# Altium footprint library Miscellaneous THD.PcbLib: 216 footprints (part 11 of 15)
Each footprint in its own frame and in the unit in brackets; x right, y up, seen from the top. Pads: shape width x height; smd on the part's side, far side on the other; paste and mask are expansions set on the pad; w line width, h text height; cw(c..) or ccw(c..) is an arc to the next point about the centre after c.
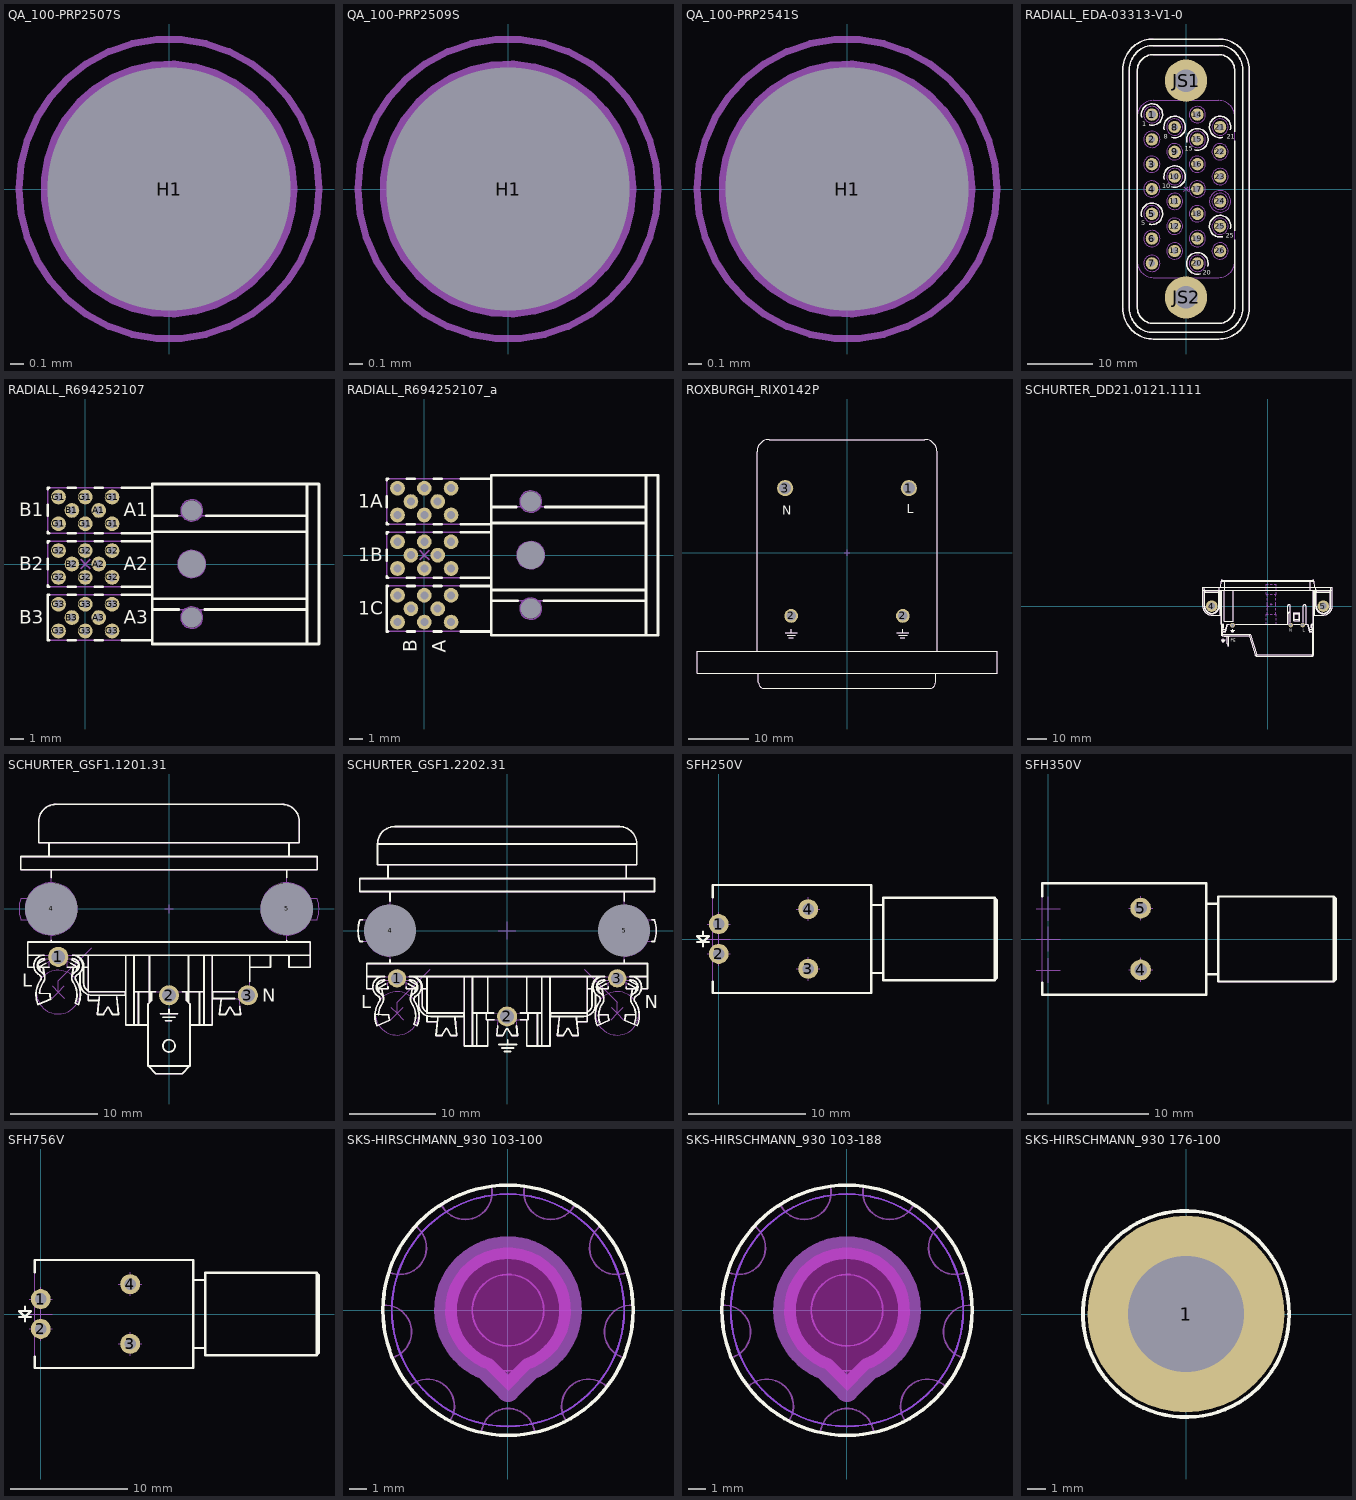
[diagram p10: the footprints below, top view; thin cyan lines are the x and y axes]

## QA_100-PRP2507S [mm] "Probe For 2.54mm Pitch, Torch Head"
height 20
pads (1):
  round 0.5 hole 1.75 unplated mask+0.625: H1(0,0)
Mechanical 8:
  lines w0.05: -0.5,0 0,0 ; 0,-0.5 0,0 ; 0,0.5 0,0 ; 0.5,0 0,0
Mechanical 14:
  circle w0.1: c0,0 r0.875
  lines w0.1: -0.375,-0.375 0.375,0.375 ; -0.375,0.375 0.375,-0.375
Mechanical 15:
  circle w0.05: c0,0 r1.08
Mechanical 16:
  circle w0.05: c0,0 r1.08
3D body "QA_100-PRP2507S.stp": height 14.75, standoff -31.96, extent -0.925,-0.925 0.925,0.925

## QA_100-PRP2509S [mm] "Probe For 2.54mm Pitch, Serrated Head"
height 20
pads (1):
  round 0.5 hole 1.75 unplated mask+0.625: H1(0,0)
Mechanical 8:
  lines w0.05: -0.5,0 0,0 ; 0,-0.5 0,0 ; 0,0.5 0,0 ; 0.5,0 0,0
Mechanical 14:
  circle w0.875: c0,0 r0.437
  circle w0.1: c0,0 r0.875
Mechanical 15:
  circle w0.05: c0,0 r1.08
Mechanical 16:
  circle w0.05: c0,0 r1.08
3D body "QA_100-PRP2509S.stp": height 14.75, standoff -31.96, extent -0.925,-0.925 0.925,0.925

## QA_100-PRP2541S [mm] "Probe For 2.54mm Pitch, Spear Head"
height 20
pads (1):
  round 0.5 hole 1.75 unplated mask+0.625: H1(0,0)
Mechanical 8:
  lines w0.05: -0.5,0 0,0 ; 0,-0.5 0,0 ; 0,0.5 0,0 ; 0.5,0 0,0
Mechanical 14:
  circle w0.2: c0,0 r0.1
  circle w0.1: c0,0 r0.875
Mechanical 15:
  circle w0.05: c0,0 r1.08
Mechanical 16:
  circle w0.05: c0,0 r1.08
3D body "QA_100-PRP2541S.stp": height 14.75, standoff -31.96, extent -0.925,-0.925 0.925,0.925

## RADIALL_EDA-03313-V1-0 [mm] "RADIALL 690522 Adapter Kit for PCB Mount, 26 Contacts Female, MMC Series"
height 33.2
pads (28):
  round 1.9 hole 1.2: 1(-5.239,11.43)
  round 1.9 hole 1: 2(-5.239,7.62) 3(-5.239,3.81) 4(-5.239,0) 5(-5.239,-3.81) 6(-5.239,-7.62) 7(-5.239,-11.43) 8(-1.746,9.525) 9(-1.746,5.715) 10(-1.746,1.905) 11(-1.746,-1.905) 12(-1.746,-5.715) 13(-1.746,-9.525) 14(1.746,11.43) 15(1.746,7.62) 16(1.746,3.81) 17(1.746,0) 18(1.746,-3.81) 19(1.746,-7.62) 20(1.746,-11.43) 21(5.239,9.525) 22(5.239,5.715) 23(5.239,1.905) 24(5.239,-1.905) 25(5.239,-5.715) 26(5.239,-9.525)
  round 6.5 hole 3.5: JS1(0,16.65) JS2(0,-16.65)
Top Overlay:
  lines w0.2: -6.833,-4.237 cw(c-5.239,-3.81) -5.666,-5.404 ; -6.833,11.003 cw(c-5.239,11.43) -5.666,9.836 ; -3.34,1.478 cw(c-1.746,1.905) -2.173,0.311 ; -3.34,9.098 cw(c-1.746,9.525) -2.173,7.931 ; 0.152,7.193 cw(c1.746,7.62) 1.319,6.026 ; 2.173,-13.024 cw(c1.746,-11.43) 3.34,-11.857 ; 5.666,-7.309 cw(c5.239,-5.715) 6.833,-6.142 ; 5.666,7.931 cw(c5.239,9.525) 6.833,9.098 ; 7.5,-7.8 7.5,-18.15 cw(c5,-18.15) 5,-20.65 -5,-20.65 cw(c-5,-18.15) -7.5,-18.15 -7.5,18.15 cw(c-5,18.15) -5,20.65 5,20.65 cw(c5,18.15) 7.5,18.15 7.5,8.8 ; 7.5,-6.4 7.5,7.4 ; -9.7,-18.35 ccw(c-5,-18.35) -5,-23.05 5,-23.05 ccw(c5,-18.35) 9.7,-18.35 9.7,18.35 ccw(c5,18.35) 5,23.05 -5,23.05 ccw(c-5,18.35) -9.7,18.35 -9.7,-18.35 ; -8.7,-18.35 ccw(c-5,-18.35) -5,-22.05 5,-22.05 ccw(c5,-18.35) 8.7,-18.35 8.7,18.35 ccw(c5,18.35) 5,22.05 -5,22.05 ccw(c-5,18.35) -8.7,18.35 -8.7,-18.35
  text "21" at 6.239,7.758 h0.75
  text "20" at 2.596,-13.197 h0.75
  text "25" at 6.089,-7.482 h0.75
  text "15" at -0.17,5.853 h0.75
  text "10" at -3.663,0.138 h0.75
  text "8" at -3.396,7.758 h0.75
  text "5" at -6.889,-5.577 h0.75
  text "1" at -6.739,9.663 h0.75
Mechanical 8:
  lines w0.1: -5.739,-11.43 -5.239,-11.43 ; -5.739,-7.62 -5.239,-7.62 ; -5.739,-3.81 -5.239,-3.81 ; -5.739,0 -5.239,0 ; -5.739,3.81 -5.239,3.81 ; -5.739,7.62 -5.239,7.62 ; -5.739,11.43 -5.239,11.43 ; -5.239,-11.93 -5.239,-11.43 ; -5.239,-10.93 -5.239,-11.43 ; -5.239,-8.12 -5.239,-7.62 ; -5.239,-7.12 -5.239,-7.62 ; -5.239,-4.31 -5.239,-3.81 ; -5.239,-3.31 -5.239,-3.81 ; -5.239,-0.5 -5.239,0 ; -5.239,0.5 -5.239,0 ; -5.239,3.31 -5.239,3.81 ; -5.239,4.31 -5.239,3.81 ; -5.239,7.12 -5.239,7.62 ; -5.239,8.12 -5.239,7.62 ; -5.239,10.93 -5.239,11.43 ; -5.239,11.93 -5.239,11.43 ; -4.739,-11.43 -5.239,-11.43 ; -4.739,-7.62 -5.239,-7.62 ; -4.739,-3.81 -5.239,-3.81 ; -4.739,0 -5.239,0 ; -4.739,3.81 -5.239,3.81 ; -4.739,7.62 -5.239,7.62 ; -4.739,11.43 -5.239,11.43 ; -2.246,-9.525 -1.746,-9.525 ; -2.246,-5.715 -1.746,-5.715 ; -2.246,-1.905 -1.746,-1.905 ; -2.246,1.905 -1.746,1.905 ; -2.246,5.715 -1.746,5.715 ; -2.246,9.525 -1.746,9.525 ; -1.746,-10.025 -1.746,-9.525 ; -1.746,-9.025 -1.746,-9.525 ; -1.746,-6.215 -1.746,-5.715 ; -1.746,-5.215 -1.746,-5.715 ; -1.746,-2.405 -1.746,-1.905 ; -1.746,-1.405 -1.746,-1.905 ; -1.746,1.405 -1.746,1.905 ; -1.746,2.405 -1.746,1.905 ; -1.746,5.215 -1.746,5.715 ; -1.746,6.215 -1.746,5.715 ; -1.746,9.025 -1.746,9.525 ; -1.746,10.025 -1.746,9.525 ; -1.246,-9.525 -1.746,-9.525 ; -1.246,-5.715 -1.746,-5.715 ; -1.246,-1.905 -1.746,-1.905 ; -1.246,1.905 -1.746,1.905 ; -1.246,5.715 -1.746,5.715 ; -1.246,9.525 -1.746,9.525 ; -0.5,-16.65 0,-16.65 ; -0.5,16.65 0,16.65 ; -0.354,-0.354 0,0 ; -0.354,0.354 0,0 ; 0,-17.15 0,-16.65 ; 0,-16.15 0,-16.65 ; 0,16.15 0,16.65 ; 0,17.15 0,16.65 ; 0.354,-0.354 0,0 ; 0.354,0.354 0,0 ; 0.5,-16.65 0,-16.65 ; 0.5,16.65 0,16.65 ; 1.246,-11.43 1.746,-11.43 ; 1.246,-7.62 1.746,-7.62 ; 1.246,-3.81 1.746,-3.81 ; 1.246,0 1.746,0 ; 1.246,3.81 1.746,3.81 ; 1.246,7.62 1.746,7.62 ; 1.246,11.43 1.746,11.43 ; 1.746,-11.93 1.746,-11.43 ; 1.746,-10.93 1.746,-11.43 ; 1.746,-8.12 1.746,-7.62 ; 1.746,-7.12 1.746,-7.62 ; 1.746,-4.31 1.746,-3.81 ; 1.746,-3.31 1.746,-3.81 ; 1.746,-0.5 1.746,0 ; 1.746,0.5 1.746,0 ; 1.746,3.31 1.746,3.81 ; 1.746,4.31 1.746,3.81 ; 1.746,7.12 1.746,7.62 ; 1.746,8.12 1.746,7.62 ; 1.746,10.93 1.746,11.43 ; 1.746,11.93 1.746,11.43 ; 2.246,-11.43 1.746,-11.43 ; 2.246,-7.62 1.746,-7.62 ; 2.246,-3.81 1.746,-3.81 ; 2.246,0 1.746,0 ; 2.246,3.81 1.746,3.81 ; 2.246,7.62 1.746,7.62 ; 2.246,11.43 1.746,11.43 ; 4.739,-9.525 5.239,-9.525 ; 4.739,-5.715 5.239,-5.715 ; 4.739,-1.905 5.239,-1.905 ; 4.739,1.905 5.239,1.905 ; 4.739,5.715 5.239,5.715 ; 4.739,9.525 5.239,9.525 ; 5.239,-10.025 5.239,-9.525 ; 5.239,-9.025 5.239,-9.525 ; 5.239,-6.215 5.239,-5.715 ; 5.239,-5.215 5.239,-5.715 ; 5.239,-2.405 5.239,-1.905 ; 5.239,-1.405 5.239,-1.905 ; 5.239,1.405 5.239,1.905 ; 5.239,2.405 5.239,1.905 ; 5.239,5.215 5.239,5.715 ; 5.239,6.215 5.239,5.715 ; 5.239,9.025 5.239,9.525 ; 5.239,10.025 5.239,9.525 ; 5.739,-9.525 5.239,-9.525 ; 5.739,-5.715 5.239,-5.715 ; 5.739,-1.905 5.239,-1.905 ; 5.739,1.905 5.239,1.905 ; 5.739,5.715 5.239,5.715 ; 5.739,9.525 5.239,9.525 ; -7.5,-11.1 ccw(c-5,-11.1) -5,-13.6 5,-13.6 ccw(c5,-11.1) 7.5,-11.1 7.5,11.1 ccw(c5,11.1) 5,13.6 -5,13.6 ccw(c-5,11.1) -7.5,11.1 -7.5,-11.1
  text "14" at 1.23,11.08 h0.75
  text "21" at 4.822,9.175 h0.75
  text "20" at 1.18,-11.78 h0.75
  text "7" at -5.472,-11.78 h0.75
  text "6" at -5.455,-7.97 h0.75
  text "13" at -2.246,-9.875 h0.75
  text "19" at 1.263,-7.97 h0.75
  text "26" at 4.689,-9.875 h0.75
  text "25" at 4.672,-6.065 h0.75
  text "24" at 4.655,-2.255 h0.75
  text "23" at 4.672,1.555 h0.75
  text "22" at 4.672,5.365 h0.75
  text "9" at -1.963,5.365 h0.75
  text "16" at 1.263,3.46 h0.75
  text "17" at 1.246,-0.35 h0.75
  text "18" at 1.246,-4.16 h0.75
  text "12" at -2.246,-6.065 h0.75
  text "11" at -2.096,-2.255 h0.75
  text "4" at -5.489,-0.35 h0.75
  text "3" at -5.472,3.46 h0.75
  text "2" at -5.472,7.27 h0.75
  text "15" at 1.246,7.27 h0.75
  text "10" at -2.246,1.555 h0.75
  text "8" at -1.98,9.175 h0.75
  text "5" at -5.472,-4.16 h0.75
  text "1" at -5.322,11.08 h0.75
Mechanical 14:
  circle w0.1: c0,-16.65 r2.4
  circle w0.1: c0,-16.65 r1.75
  circle w0.1: c0,16.65 r1.75
  circle w0.1: c0,16.65 r1
  circle w0.1: c1.746,11.43 r1.25
  circle w0.1: c5.239,9.525 r1.25
  circle w0.1: c1.746,-11.43 r1.25
  circle w0.1: c-5.239,-11.43 r1.25
  circle w0.1: c-5.239,-7.62 r1.25
  circle w0.1: c-1.746,-9.525 r1.25
  circle w0.1: c1.746,-7.62 r1.25
  circle w0.1: c5.239,-9.525 r1.25
  circle w0.1: c5.239,-5.715 r1.25
  circle w0.1: c5.239,-1.905 r1.25
  circle w0.1: c5.239,-1.905 r1.65
  circle w0.1: c5.239,1.905 r1.25
  circle w0.1: c5.239,5.715 r1.25
  circle w0.1: c-1.746,5.715 r1.25
  circle w0.1: c1.746,3.81 r1.25
  circle w0.1: c1.746,0 r1.25
  circle w0.1: c1.746,-3.81 r1.25
  circle w0.1: c-1.746,-5.715 r1.25
  circle w0.1: c-1.746,-1.905 r1.25
  circle w0.1: c-5.239,0 r1.25
  circle w0.1: c-5.239,3.81 r1.25
  circle w0.1: c-5.239,7.62 r1.25
  circle w0.1: c1.746,7.62 r1.25
  circle w0.1: c-1.746,1.905 r1.25
  circle w0.1: c-1.746,9.525 r1.25
  circle w0.1: c-5.239,-3.81 r1.25
  circle w0.1: c-5.239,11.43 r1.25
  lines w0.1: -6.833,-4.237 cw(c-5.239,-3.81) -5.666,-5.404 ; -6.833,11.003 cw(c-5.239,11.43) -5.666,9.836 ; -3.34,1.478 cw(c-1.746,1.905) -2.173,0.311 ; -3.34,9.098 cw(c-1.746,9.525) -2.173,7.931 ; 0.152,7.193 cw(c1.746,7.62) 1.319,6.026 ; 2.173,-13.024 cw(c1.746,-11.43) 3.34,-11.857 ; 5.666,-7.309 cw(c5.239,-5.715) 6.833,-6.142 ; 5.666,7.931 cw(c5.239,9.525) 6.833,9.098 ; -9.7,-18.35 ccw(c-5,-18.35) -5,-23.05 5,-23.05 ccw(c5,-18.35) 9.7,-18.35 9.7,18.35 ccw(c5,18.35) 5,23.05 -5,23.05 ccw(c-5,18.35) -9.7,18.35 -9.7,-18.35 ; -8.7,-18.35 ccw(c-5,-18.35) -5,-22.05 5,-22.05 ccw(c5,-18.35) 8.7,-18.35 8.7,18.35 ccw(c5,18.35) 5,22.05 -5,22.05 ccw(c-5,18.35) -8.7,18.35 -8.7,-18.35 ; -7.5,-18.15 ccw(c-5,-18.15) -5,-20.65 5,-20.65 ccw(c5,-18.15) 7.5,-18.15 7.5,18.15 ccw(c5,18.15) 5,20.65 -5,20.65 ccw(c-5,18.15) -7.5,18.15 -7.5,-18.15 ; -2.887,16.65 -1.443,14.15 1.443,14.15 2.887,16.65 1.443,19.15 -1.443,19.15 -2.887,16.65 ; -2.771,-16.65 -1.386,-19.05 1.386,-19.05 2.771,-16.65 1.386,-14.25 -1.386,-14.25 -2.771,-16.65
  text "21" at 6.239,7.758 h0.75
  text "20" at 2.596,-13.197 h0.75
  text "25" at 6.089,-7.482 h0.75
  text "15" at -0.17,5.853 h0.75
  text "10" at -3.663,0.138 h0.75
  text "8" at -3.396,7.758 h0.75
  text "5" at -6.889,-5.577 h0.75
  text "1" at -6.739,9.663 h0.75
3D body "EDA-03313-V1-0_Part1.stp": height 33.2, standoff -2.6, extent -9.7,-23.05 9.7,23.05
3D body "EDA-03313-V1-0_Part2.stp": height 4, standoff -4.4, extent -2.994,-19.649 2.994,19.632

## RADIALL_R694252107 [mm] "COAXIPAK 2 Series, 6 Ways 50 ohm RF Coaxial Right Angle Jack Module"
height 11.8
pads (27):
  round 1.1 hole 0.6: A1(1,4) A2(1,0) A3(1,-4) B1(-1,4) B2(-1,0) B3(-1,-4) G1(-2,3) G1(-2,5) G1(0,3) G1(0,5) G1(2,3) G1(2,5) G2(-2,-1) G2(-2,1) G2(0,-1) G2(0,1) G2(2,-1) G2(2,1) G3(-2,-5) G3(-2,-3) G3(0,-5) G3(0,-3) G3(2,-5) G3(2,-3)
  round 1 hole 1.5 unplated mask+0.25: MECH(7.95,-4) MECH(7.95,4)
  round 1 hole 2.05 unplated mask+0.525: MECH(7.95,0)
Top Overlay:
  lines w0.2: -2.8,-1.6 -2.8,-1.7 -2.714,-1.7 ; -2.8,-0.4 -2.8,0.4 ; -2.8,1.6 -2.8,1.7 -2.714,1.7 ; -2.8,2.4 -2.8,2.3 -2.714,2.3 ; -2.8,3.6 -2.8,4.4 ; -2.8,5.6 -2.8,5.7 -2.714,5.7 ; -2.714,-5.7 -2.8,-5.7 -2.8,-2.3 -2.714,-2.3 ; -1.286,-5.7 -0.714,-5.7 ; -1.286,-2.3 -0.714,-2.3 ; -1.286,-1.7 -0.714,-1.7 ; -1.286,1.7 -0.714,1.7 ; -1.286,2.3 -0.714,2.3 ; -1.286,5.7 -0.714,5.7 ; 0.714,-5.7 1.286,-5.7 ; 0.714,-2.3 1.286,-2.3 ; 0.714,-1.7 1.286,-1.7 ; 0.714,1.7 1.286,1.7 ; 0.714,2.3 1.286,2.3 ; 0.714,5.7 1.286,5.7 ; 2.714,-5.7 5,-5.7 ; 2.714,-2.3 5,-2.3 ; 2.714,-1.7 5,-1.7 ; 2.714,1.7 5,1.7 ; 2.714,2.3 5,2.3 ; 2.714,5.7 5,5.7 ; 5,-3.4 6.969,-3.4 ; 5,-2.6 16.55,-2.6 ; 5,2.4 16.55,2.4 ; 5,3.6 6.872,3.6 ; 8.931,-3.4 16.55,-3.4 ; 9.028,3.6 16.55,3.6 ; 16.55,-5.975 16.55,5.975 ; 5,-5.975 17.45,-5.975 17.45,5.975 5,5.975 5,-5.975
  text "A1" at 2.864,3.55 h1
  text "A2" at 2.864,-0.45 h1
  text "A3" at 2.864,-4.45 h1
  text "B3" at -4.95,-4.45 h1
  text "B2" at -4.95,-0.45 h1
  text "B1" at -4.95,3.55 h1
Mechanical 8:
  circle w0.1: c7.95,0 r1.025
  circle w0.1: c7.95,4 r0.8
  circle w0.1: c7.95,-4 r0.8
  circle w0.1: c2,5 r0.3
  circle w0.1: c1,4 r0.3
  circle w0.1: c-1,4 r0.3
  circle w0.1: c2,1 r0.3
  circle w0.1: c1,0 r0.3
  circle w0.1: c-1,0 r0.3
  circle w0.1: c-2,-3 r0.3
  circle w0.1: c0,-3 r0.3
  circle w0.1: c2,-3 r0.3
  circle w0.1: c1,-4 r0.3
  circle w0.1: c2,-5 r0.3
  circle w0.1: c0,-5 r0.3
  circle w0.1: c-2,-5 r0.3
  circle w0.1: c-1,-4 r0.3
  circle w0.1: c-2,1 r0.3
  circle w0.1: c0,1 r0.3
  circle w0.1: c2,-1 r0.3
  circle w0.1: c0,-1 r0.3
  circle w0.1: c-2,-1 r0.3
  circle w0.1: c-2,5 r0.3
  circle w0.1: c0,5 r0.3
  circle w0.1: c2,3 r0.3
  circle w0.1: c0,3 r0.3
  circle w0.1: c-2,3 r0.3
  lines w0.1: -2.5,-5 -2,-5 ; -2.5,-3 -2,-3 ; -2.5,-1 -2,-1 ; -2.5,1 -2,1 ; -2.5,3 -2,3 ; -2.5,5 -2,5 ; -2,-5.5 -2,-5 ; -2,-4.5 -2,-5 ; -2,-3.5 -2,-3 ; -2,-2.5 -2,-3 ; -2,-1.5 -2,-1 ; -2,-0.5 -2,-1 ; -2,0.5 -2,1 ; -2,1.5 -2,1 ; -2,2.5 -2,3 ; -2,3.5 -2,3 ; -2,4.5 -2,5 ; -2,5.5 -2,5 ; -1.5,-5 -2,-5 ; -1.5,-4 -1,-4 ; -1.5,-3 -2,-3 ; -1.5,-1 -2,-1 ; -1.5,0 -1,0 ; -1.5,1 -2,1 ; -1.5,3 -2,3 ; -1.5,4 -1,4 ; -1.5,5 -2,5 ; -1,-4.5 -1,-4 ; -1,-3.5 -1,-4 ; -1,-0.5 -1,0 ; -1,0.5 -1,0 ; -1,3.5 -1,4 ; -1,4.5 -1,4 ; -0.5,-5 0,-5 ; -0.5,-4 -1,-4 ; -0.5,-3 0,-3 ; -0.5,-1 0,-1 ; -0.5,0 -1,0 ; -0.5,1 0,1 ; -0.5,3 0,3 ; -0.5,4 -1,4 ; -0.5,5 0,5 ; -0.354,-0.354 0,0 ; -0.354,0.354 0,0 ; 0,-5.5 0,-5 ; 0,-4.5 0,-5 ; 0,-3.5 0,-3 ; 0,-2.5 0,-3 ; 0,-1.5 0,-1 ; 0,-0.5 0,-1 ; 0,0.5 0,1 ; 0,1.5 0,1 ; 0,2.5 0,3 ; 0,3.5 0,3 ; 0,4.5 0,5 ; 0,5.5 0,5 ; 0.354,-0.354 0,0 ; 0.354,0.354 0,0 ; 0.5,-5 0,-5 ; 0.5,-4 1,-4 ; 0.5,-3 0,-3 ; 0.5,-1 0,-1 ; 0.5,0 1,0 ; 0.5,1 0,1 ; 0.5,3 0,3 ; 0.5,4 1,4 ; 0.5,5 0,5 ; 1,-4.5 1,-4 ; 1,-3.5 1,-4 ; 1,-0.5 1,0 ; 1,0.5 1,0 ; 1,3.5 1,4 ; 1,4.5 1,4 ; 1.5,-5 2,-5 ; 1.5,-4 1,-4 ; 1.5,-3 2,-3 ; 1.5,-1 2,-1 ; 1.5,0 1,0 ; 1.5,1 2,1 ; 1.5,3 2,3 ; 1.5,4 1,4 ; 1.5,5 2,5 ; 2,-5.5 2,-5 ; 2,-4.5 2,-5 ; 2,-3.5 2,-3 ; 2,-2.5 2,-3 ; 2,-1.5 2,-1 ; 2,-0.5 2,-1 ; 2,0.5 2,1 ; 2,1.5 2,1 ; 2,2.5 2,3 ; 2,3.5 2,3 ; 2,4.5 2,5 ; 2,5.5 2,5 ; 2.5,-5 2,-5 ; 2.5,-3 2,-3 ; 2.5,-1 2,-1 ; 2.5,1 2,1 ; 2.5,3 2,3 ; 2.5,5 2,5 ; 7.45,-4 7.95,-4 ; 7.45,0 7.95,0 ; 7.45,4 7.95,4 ; 7.95,-4.5 7.95,-4 ; 7.95,-3.5 7.95,-4 ; 7.95,-0.5 7.95,0 ; 7.95,0.5 7.95,0 ; 7.95,3.5 7.95,4 ; 7.95,4.5 7.95,4 ; 8.45,-4 7.95,-4 ; 8.45,0 7.95,0 ; 8.45,4 7.95,4
Mechanical 14:
  lines w0.1: 5,-5.7 -2.8,-5.7 -2.8,-2.3 5,-2.3 ; 5,-3.4 16.55,-3.4 ; 5,-2.6 16.55,-2.6 ; 5,-1.7 -2.8,-1.7 -2.8,1.7 5,1.7 ; 5,2.3 -2.8,2.3 -2.8,5.7 5,5.7 ; 5,2.4 16.55,2.4 ; 5,3.6 16.55,3.6 ; 16.55,-5.975 16.55,5.975 ; 5,-5.975 17.45,-5.975 17.45,5.975 5,5.975 5,-5.975
  text "B3" at -4.95,-4.45 h1
  text "B2" at -4.95,-0.45 h1
  text "B1" at -4.95,3.55 h1
  text "A1" at 2.864,3.55 h1
  text "A2" at 2.864,-0.45 h1
  text "A3" at 2.864,-4.45 h1
3D body "RADIALL_R694252107.stp": height 9.3, standoff -3.05, extent -2.8,-5.975 17.45,5.975

## RADIALL_R694252107_a [mm] "COAXIPAK 2 Series, 6 Ways 50 ohm RF Coaxial Right Angle Jack Module"
height 11.8
pads (27):
  round 1.1 hole 0.6: 1A-A(1,4) 1A-B(-1,4) 1A-G(-2,3) 1A-G(-2,5) 1A-G(0,3) 1A-G(0,5) 1A-G(2,3) 1A-G(2,5) 1B-A(1,0) 1B-B(-1,0) 1B-G(-2,-1) 1B-G(-2,1) 1B-G(0,-1) 1B-G(0,1) 1B-G(2,-1) 1B-G(2,1) 1C-A(1,-4) 1C-B(-1,-4) 1C-G(-2,-5) 1C-G(-2,-3) 1C-G(0,-5) 1C-G(0,-3) 1C-G(2,-5) 1C-G(2,-3)
  round 1 hole 1.5 unplated mask+0.25: MECH(7.95,-4) MECH(7.95,4)
  round 1 hole 2.05 unplated mask+0.525: MECH(7.95,0)
Top Overlay:
  lines w0.2: -2.8,-1.6 -2.8,-1.7 -2.714,-1.7 ; -2.8,-0.4 -2.8,0.4 ; -2.8,1.6 -2.8,1.7 -2.714,1.7 ; -2.8,2.4 -2.8,2.3 -2.714,2.3 ; -2.8,3.6 -2.8,4.4 ; -2.8,5.6 -2.8,5.7 -2.714,5.7 ; -2.714,-5.7 -2.8,-5.7 -2.8,-2.3 -2.714,-2.3 ; -1.286,-5.7 -0.714,-5.7 ; -1.286,-2.3 -0.714,-2.3 ; -1.286,-1.7 -0.714,-1.7 ; -1.286,1.7 -0.714,1.7 ; -1.286,2.3 -0.714,2.3 ; -1.286,5.7 -0.714,5.7 ; 0.714,-5.7 1.286,-5.7 ; 0.714,-2.3 1.286,-2.3 ; 0.714,-1.7 1.286,-1.7 ; 0.714,1.7 1.286,1.7 ; 0.714,2.3 1.286,2.3 ; 0.714,5.7 1.286,5.7 ; 2.714,-5.7 5,-5.7 ; 2.714,-2.3 5,-2.3 ; 2.714,-1.7 5,-1.7 ; 2.714,1.7 5,1.7 ; 2.714,2.3 5,2.3 ; 2.714,5.7 5,5.7 ; 5,-3.4 6.969,-3.4 ; 5,-2.6 16.55,-2.6 ; 5,2.4 16.55,2.4 ; 5,3.6 6.872,3.6 ; 8.931,-3.4 16.55,-3.4 ; 9.028,3.6 16.55,3.6 ; 16.55,-5.975 16.55,5.975 ; 5,-5.975 17.45,-5.975 17.45,5.975 5,5.975 5,-5.975
  text "A" at 1.6,-7.3 h1
  text "B" at -0.564,-7.25 h1
  text "1C" at -4.95,-4.45 h1
  text "1B" at -4.95,-0.45 h1
  text "1A" at -4.95,3.55 h1
Mechanical 8:
  circle w0.1: c7.95,0 r1.025
  circle w0.1: c7.95,4 r0.8
  circle w0.1: c7.95,-4 r0.8
  circle w0.1: c2,5 r0.3
  circle w0.1: c1,4 r0.3
  circle w0.1: c-1,4 r0.3
  circle w0.1: c2,1 r0.3
  circle w0.1: c1,0 r0.3
  circle w0.1: c-1,0 r0.3
  circle w0.1: c-2,-3 r0.3
  circle w0.1: c0,-3 r0.3
  circle w0.1: c2,-3 r0.3
  circle w0.1: c1,-4 r0.3
  circle w0.1: c2,-5 r0.3
  circle w0.1: c0,-5 r0.3
  circle w0.1: c-2,-5 r0.3
  circle w0.1: c-1,-4 r0.3
  circle w0.1: c-2,1 r0.3
  circle w0.1: c0,1 r0.3
  circle w0.1: c2,-1 r0.3
  circle w0.1: c0,-1 r0.3
  circle w0.1: c-2,-1 r0.3
  circle w0.1: c-2,5 r0.3
  circle w0.1: c0,5 r0.3
  circle w0.1: c2,3 r0.3
  circle w0.1: c0,3 r0.3
  circle w0.1: c-2,3 r0.3
  lines w0.1: -2.5,-5 -2,-5 ; -2.5,-3 -2,-3 ; -2.5,-1 -2,-1 ; -2.5,1 -2,1 ; -2.5,3 -2,3 ; -2.5,5 -2,5 ; -2,-5.5 -2,-5 ; -2,-4.5 -2,-5 ; -2,-3.5 -2,-3 ; -2,-2.5 -2,-3 ; -2,-1.5 -2,-1 ; -2,-0.5 -2,-1 ; -2,0.5 -2,1 ; -2,1.5 -2,1 ; -2,2.5 -2,3 ; -2,3.5 -2,3 ; -2,4.5 -2,5 ; -2,5.5 -2,5 ; -1.5,-5 -2,-5 ; -1.5,-4 -1,-4 ; -1.5,-3 -2,-3 ; -1.5,-1 -2,-1 ; -1.5,0 -1,0 ; -1.5,1 -2,1 ; -1.5,3 -2,3 ; -1.5,4 -1,4 ; -1.5,5 -2,5 ; -1,-4.5 -1,-4 ; -1,-3.5 -1,-4 ; -1,-0.5 -1,0 ; -1,0.5 -1,0 ; -1,3.5 -1,4 ; -1,4.5 -1,4 ; -0.5,-5 0,-5 ; -0.5,-4 -1,-4 ; -0.5,-3 0,-3 ; -0.5,-1 0,-1 ; -0.5,0 -1,0 ; -0.5,1 0,1 ; -0.5,3 0,3 ; -0.5,4 -1,4 ; -0.5,5 0,5 ; -0.354,-0.354 0,0 ; -0.354,0.354 0,0 ; 0,-5.5 0,-5 ; 0,-4.5 0,-5 ; 0,-3.5 0,-3 ; 0,-2.5 0,-3 ; 0,-1.5 0,-1 ; 0,-0.5 0,-1 ; 0,0.5 0,1 ; 0,1.5 0,1 ; 0,2.5 0,3 ; 0,3.5 0,3 ; 0,4.5 0,5 ; 0,5.5 0,5 ; 0.354,-0.354 0,0 ; 0.354,0.354 0,0 ; 0.5,-5 0,-5 ; 0.5,-4 1,-4 ; 0.5,-3 0,-3 ; 0.5,-1 0,-1 ; 0.5,0 1,0 ; 0.5,1 0,1 ; 0.5,3 0,3 ; 0.5,4 1,4 ; 0.5,5 0,5 ; 1,-4.5 1,-4 ; 1,-3.5 1,-4 ; 1,-0.5 1,0 ; 1,0.5 1,0 ; 1,3.5 1,4 ; 1,4.5 1,4 ; 1.5,-5 2,-5 ; 1.5,-4 1,-4 ; 1.5,-3 2,-3 ; 1.5,-1 2,-1 ; 1.5,0 1,0 ; 1.5,1 2,1 ; 1.5,3 2,3 ; 1.5,4 1,4 ; 1.5,5 2,5 ; 2,-5.5 2,-5 ; 2,-4.5 2,-5 ; 2,-3.5 2,-3 ; 2,-2.5 2,-3 ; 2,-1.5 2,-1 ; 2,-0.5 2,-1 ; 2,0.5 2,1 ; 2,1.5 2,1 ; 2,2.5 2,3 ; 2,3.5 2,3 ; 2,4.5 2,5 ; 2,5.5 2,5 ; 2.5,-5 2,-5 ; 2.5,-3 2,-3 ; 2.5,-1 2,-1 ; 2.5,1 2,1 ; 2.5,3 2,3 ; 2.5,5 2,5 ; 7.45,-4 7.95,-4 ; 7.45,0 7.95,0 ; 7.45,4 7.95,4 ; 7.95,-4.5 7.95,-4 ; 7.95,-3.5 7.95,-4 ; 7.95,-0.5 7.95,0 ; 7.95,0.5 7.95,0 ; 7.95,3.5 7.95,4 ; 7.95,4.5 7.95,4 ; 8.45,-4 7.95,-4 ; 8.45,0 7.95,0 ; 8.45,4 7.95,4